# Altium footprint library microbuilder.PCBLIB: 422 footprints (part 16 of 27)
Each footprint in its own frame and in the unit in brackets; x right, y up, seen from the top. Pads: shape width x height; smd on the part's side, far side on the other; paste and mask are expansions set on the pad; w line width, h text height; cw(c..) or ccw(c..) is an arc to the next point about the centre after c.
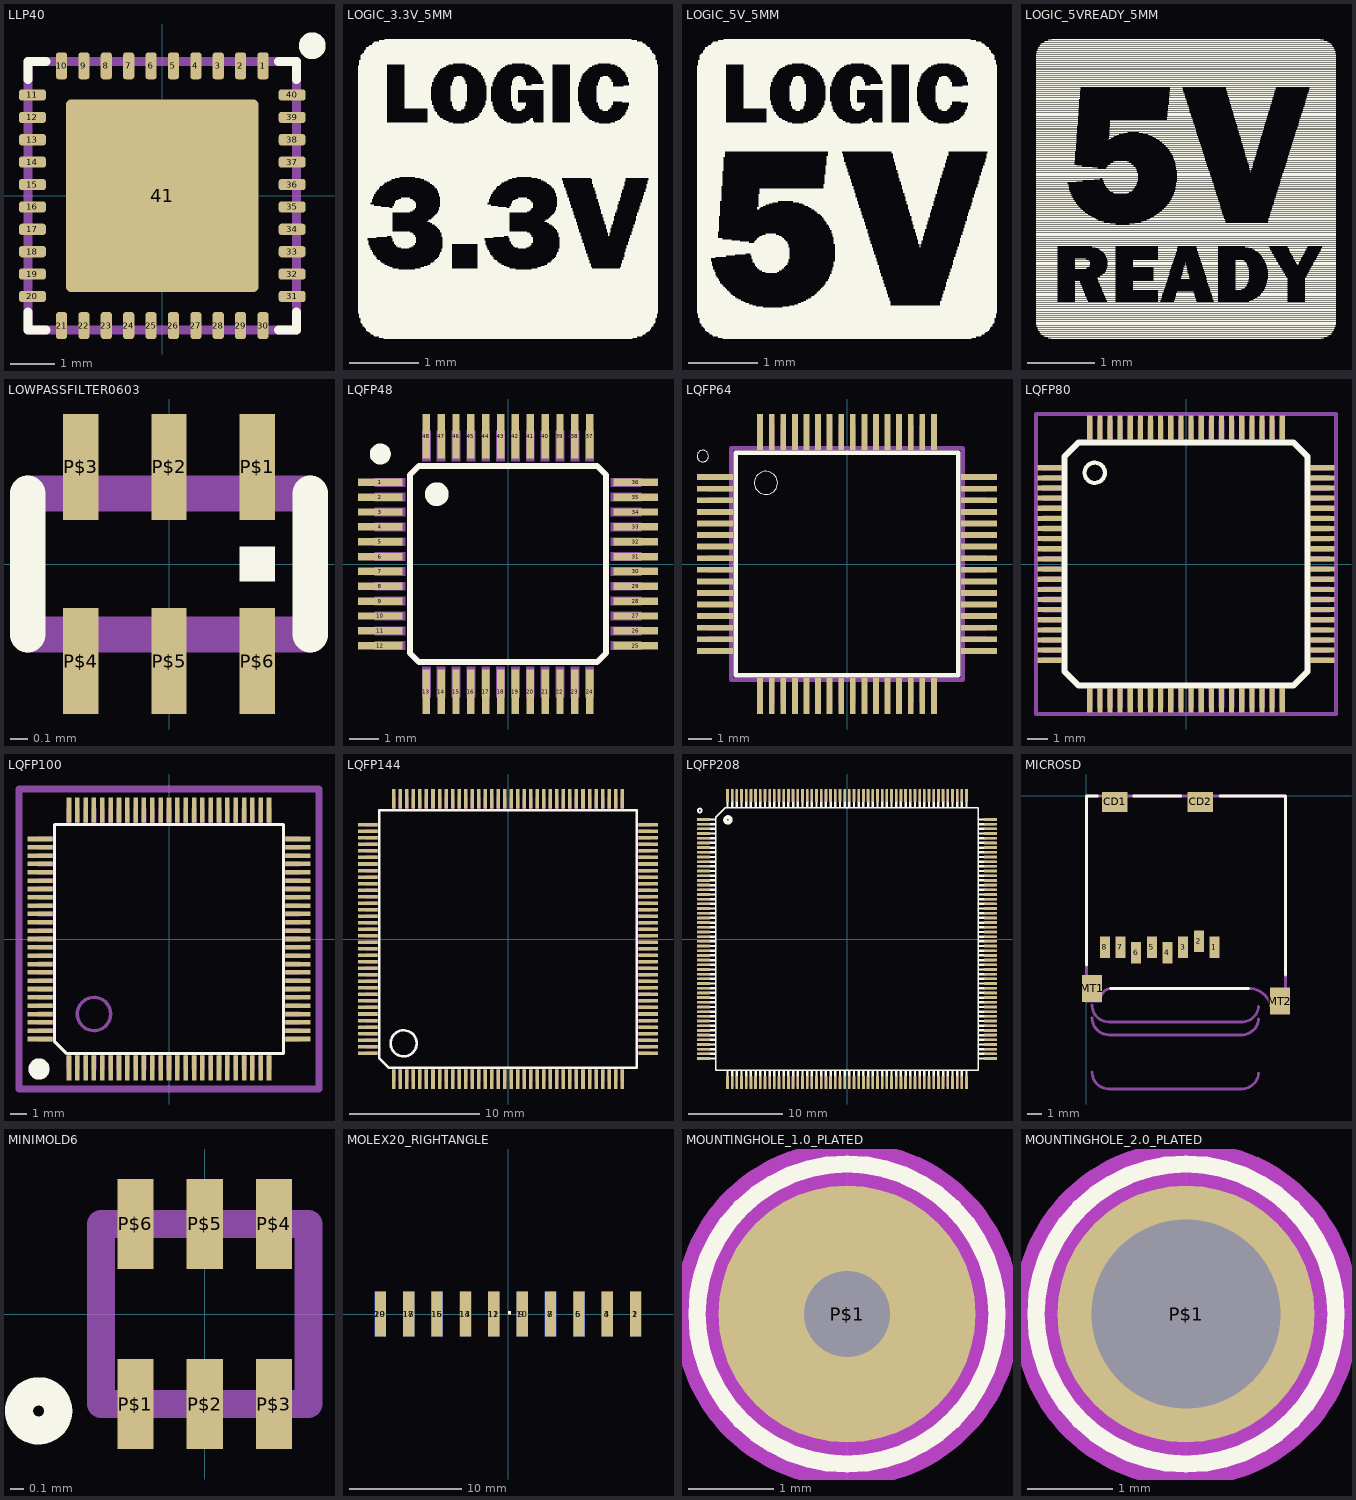
[diagram p15: the footprints below, top view; thin cyan lines are the x and y axes]

## LLP40 [mm]
pads (41):
  rrect50% 0.25x0.6 smd: 1(2.25,2.9) 2(1.75,2.9) 3(1.25,2.9) 4(0.75,2.9) 5(0.25,2.9) 6(-0.25,2.9) 7(-0.75,2.9) 8(-1.25,2.9) 9(-1.75,2.9) 10(-2.25,2.9) 21(-2.25,-2.9) 22(-1.75,-2.9) 23(-1.25,-2.9) 24(-0.75,-2.9) 25(-0.25,-2.9) 26(0.25,-2.9) 27(0.75,-2.9) 28(1.25,-2.9) 29(1.75,-2.9) 30(2.25,-2.9)
  rrect50% 0.6x0.25 smd: 11(-2.9,2.25) 12(-2.9,1.75) 13(-2.9,1.25) 14(-2.9,0.75) 15(-2.9,0.25) 16(-2.9,-0.25) 17(-2.9,-0.75) 18(-2.9,-1.25) 19(-2.9,-1.75) 20(-2.9,-2.25) 31(2.9,-2.25) 32(2.9,-1.75) 33(2.9,-1.25) 34(2.9,-0.75) 35(2.9,-0.25) 36(2.9,0.25) 37(2.9,0.75) 38(2.9,1.25) 39(2.9,1.75) 40(2.9,2.25)
  rrect5% 4.3x4.3 smd: 41(0,0)
Top Overlay:
  circle w0.3: c3.35,3.35 r0.15
  lines w0.203: -3,-2.6 -3,-3 -2.6,-3 ; -3,2.6 -3,3 -2.6,3 ; 2.6,-3 3,-3 3,-2.6 ; 2.6,3 3,3 3,2.6
Top Paste:
  rectangle: -2,1 -1,2
  rectangle: -0.5,1 0.5,2
  rectangle: 1,1 2,2
  rectangle: 1,-0.5 2,0.5
  rectangle: -0.5,-0.5 0.5,0.5
  rectangle: -2,-0.5 -1,0.5
  rectangle: -2,-2 -1,-1
  rectangle: -0.5,-2 0.5,-1
  rectangle: 1,-2 2,-1
Mechanical 16:
  lines w0.203: -3,-3 -3,3 3,3 3,-3 -3,-3

## LOGIC_3.3V_5MM [mm]
Top Overlay:
  drawing of 941 lines, arcs and shapes, not listed

## LOGIC_5V_5MM [mm]
Top Overlay:
  drawing of 975 lines, arcs and shapes, not listed

## LOGIC_5VREADY_5MM [mm]
Top Overlay:
  drawing of 1595 lines, arcs and shapes, not listed

## LOWPASSFILTER0603 [mm]
pads (6):
  rect 0.2x0.6 smd: P$1(0.5,0.55) P$2(0,0.55) P$3(-0.5,0.55) P$4(-0.5,-0.55) P$5(0,-0.55) P$6(0.5,-0.55)
Top Overlay:
  rectangle: 0.4,-0.1 0.6,0.1
  lines w0.203: -0.8,-0.4 -0.8,0.4 ; 0.8,-0.4 0.8,0.4
Mechanical 16:
  lines w0.127: -0.8,-0.4 -0.8,0.4 ; 0.8,-0.4 0.8,0.4
  lines w0.203: -0.8,-0.4 0.8,-0.4 ; -0.8,0.4 0.8,0.4

## LQFP48 [mm]
pads (48):
  rect 1.5x0.25 smd: 1(-4.3,2.75) 2(-4.3,2.25) 3(-4.3,1.75) 4(-4.3,1.25) 5(-4.3,0.75) 6(-4.3,0.25) 7(-4.3,-0.25) 8(-4.3,-0.75) 9(-4.3,-1.25) 10(-4.3,-1.75) 11(-4.3,-2.25) 12(-4.3,-2.75) 25(4.3,-2.75) 26(4.3,-2.25) 27(4.3,-1.75) 28(4.3,-1.25) 29(4.3,-0.75) 30(4.3,-0.25) 31(4.3,0.25) 32(4.3,0.75) 33(4.3,1.25) 34(4.3,1.75) 35(4.3,2.25) 36(4.3,2.75)
  rect 0.25x1.5 smd: 13(-2.75,-4.3) 14(-2.25,-4.3) 15(-1.75,-4.3) 16(-1.25,-4.3) 17(-0.75,-4.3) 18(-0.25,-4.3) 19(0.25,-4.3) 20(0.75,-4.3) 21(1.25,-4.3) 22(1.75,-4.3) 23(2.25,-4.3) 24(2.75,-4.3) 37(2.75,4.3) 38(2.25,4.3) 39(1.75,4.3) 40(1.25,4.3) 41(0.75,4.3) 42(0.25,4.3) 43(-0.25,4.3) 44(-0.75,4.3) 45(-1.25,4.3) 46(-1.75,4.3) 47(-2.25,4.3) 48(-2.75,4.3)
Top Overlay:
  circle w0.406: c-4.3,3.704 r0.15
  circle w0.4: c-2.4,2.35 r0.2
  lines w0.203: -3.3,-3 -3.3,3 -3,3.3 3,3.3 3.3,3 3.3,-3 3,-3.3 -3,-3.3 -3.3,-3
Mechanical 16:
  rectangle: -4.5,2.6 -3.45,2.9
  rectangle: -4.5,2.1 -3.45,2.4
  rectangle: -4.5,1.6 -3.45,1.9
  rectangle: -4.5,1.1 -3.45,1.4
  rectangle: -4.5,0.6 -3.45,0.9
  rectangle: -4.5,0.1 -3.45,0.4
  rectangle: -4.5,-0.4 -3.45,-0.1
  rectangle: -4.5,-0.9 -3.45,-0.6
  rectangle: -4.5,-1.4 -3.45,-1.1
  rectangle: -4.5,-1.9 -3.45,-1.6
  rectangle: -4.5,-2.4 -3.45,-2.1
  rectangle: -4.5,-2.9 -3.45,-2.6
  rectangle: -2.9,-4.5 -2.6,-3.45
  rectangle: -2.4,-4.5 -2.1,-3.45
  rectangle: -1.9,-4.5 -1.6,-3.45
  rectangle: -1.4,-4.5 -1.1,-3.45
  rectangle: -0.9,-4.5 -0.6,-3.45
  rectangle: -0.4,-4.5 -0.1,-3.45
  rectangle: 0.1,-4.5 0.4,-3.45
  rectangle: 0.6,-4.5 0.9,-3.45
  rectangle: 1.1,-4.5 1.4,-3.45
  rectangle: 1.6,-4.5 1.9,-3.45
  rectangle: 2.1,-4.5 2.4,-3.45
  rectangle: 2.6,-4.5 2.9,-3.45
  rectangle: 3.45,-2.9 4.5,-2.6
  rectangle: 3.45,-2.4 4.5,-2.1
  rectangle: 3.45,-1.9 4.5,-1.6
  rectangle: 3.45,-1.4 4.5,-1.1
  rectangle: 3.45,-0.9 4.5,-0.6
  rectangle: 3.45,-0.4 4.5,-0.1
  rectangle: 3.45,0.1 4.5,0.4
  rectangle: 3.45,0.6 4.5,0.9
  rectangle: 3.45,1.1 4.5,1.4
  rectangle: 3.45,1.6 4.5,1.9
  rectangle: 3.45,2.1 4.5,2.4
  rectangle: 3.45,2.6 4.5,2.9
  rectangle: 2.6,3.45 2.9,4.5
  rectangle: 2.1,3.45 2.4,4.5
  rectangle: 1.6,3.45 1.9,4.5
  rectangle: 1.1,3.45 1.4,4.5
  rectangle: 0.6,3.45 0.9,4.5
  rectangle: 0.1,3.45 0.4,4.5
  rectangle: -0.4,3.45 -0.1,4.5
  rectangle: -0.9,3.45 -0.6,4.5
  rectangle: -1.4,3.45 -1.1,4.5
  rectangle: -1.9,3.45 -1.6,4.5
  rectangle: -2.4,3.45 -2.1,4.5
  rectangle: -2.9,3.45 -2.6,4.5

## LQFP64 [mm]
pads (64):
  rect 1.55x0.25 smd: 1(-5.7,3.75) 2(-5.7,3.25) 3(-5.7,2.75) 4(-5.7,2.25) 5(-5.7,1.75) 6(-5.7,1.25) 7(-5.7,0.75) 8(-5.7,0.25) 9(-5.7,-0.25) 10(-5.7,-0.75) 11(-5.7,-1.25) 12(-5.7,-1.75) 13(-5.7,-2.25) 14(-5.7,-2.75) 15(-5.7,-3.25) 16(-5.7,-3.75) 33(5.7,-3.75) 34(5.7,-3.25) 35(5.7,-2.75) 36(5.7,-2.25) 37(5.7,-1.75) 38(5.7,-1.25) 39(5.7,-0.75) 40(5.7,-0.25) 41(5.7,0.25) 42(5.7,0.75) 43(5.7,1.25) 44(5.7,1.75) 45(5.7,2.25) 46(5.7,2.75) 47(5.7,3.25) 48(5.7,3.75)
  rect 0.25x1.55 smd: 17(-3.75,-5.7) 18(-3.25,-5.7) 19(-2.75,-5.7) 20(-2.25,-5.7) 21(-1.75,-5.7) 22(-1.25,-5.7) 23(-0.75,-5.7) 24(-0.25,-5.7) 25(0.25,-5.7) 26(0.75,-5.7) 27(1.25,-5.7) 28(1.75,-5.7) 29(2.25,-5.7) 30(2.75,-5.7) 31(3.25,-5.7) 32(3.75,-5.7) 49(3.75,5.7) 50(3.25,5.7) 51(2.75,5.7) 52(2.25,5.7) 53(1.75,5.7) 54(1.25,5.7) 55(0.75,5.7) 56(0.25,5.7) 57(-0.25,5.7) 58(-0.75,5.7) 59(-1.25,5.7) 60(-1.75,5.7) 61(-2.25,5.7) 62(-2.75,5.7) 63(-3.25,5.7) 64(-3.75,5.7)
Top Overlay:
  circle w0: c-6.225,4.658 r0.25
  circle w0: c-3.5,3.5 r0.5
  lines w0.203: -4.8,-4.8 -4.8,4.8 4.8,4.8 4.8,-4.8 -4.8,-4.8
Mechanical 16:
  rectangle: -6,3.64 -5,3.86
  rectangle: -6,3.14 -5,3.36
  rectangle: -6,2.64 -5,2.86
  rectangle: -6,2.14 -5,2.36
  rectangle: -6,1.64 -5,1.86
  rectangle: -6,1.14 -5,1.36
  rectangle: -6,0.64 -5,0.86
  rectangle: -6,0.14 -5,0.36
  rectangle: -6,-0.36 -5,-0.14
  rectangle: -6,-0.86 -5,-0.64
  rectangle: -6,-1.36 -5,-1.14
  rectangle: -6,-1.86 -5,-1.64
  rectangle: -6,-2.36 -5,-2.14
  rectangle: -6,-2.86 -5,-2.64
  rectangle: -6,-3.36 -5,-3.14
  rectangle: -6,-3.86 -5,-3.64
  rectangle: -3.86,-6 -3.64,-5
  rectangle: -3.36,-6 -3.14,-5
  rectangle: -2.86,-6 -2.64,-5
  rectangle: -2.36,-6 -2.14,-5
  rectangle: -1.86,-6 -1.64,-5
  rectangle: -1.36,-6 -1.14,-5
  rectangle: -0.86,-6 -0.64,-5
  rectangle: -0.36,-6 -0.14,-5
  rectangle: 0.14,-6 0.36,-5
  rectangle: 0.64,-6 0.86,-5
  rectangle: 1.14,-6 1.36,-5
  rectangle: 1.64,-6 1.86,-5
  rectangle: 2.14,-6 2.36,-5
  rectangle: 2.64,-6 2.86,-5
  rectangle: 3.14,-6 3.36,-5
  rectangle: 3.64,-6 3.86,-5
  rectangle: 5,-3.86 6,-3.64
  rectangle: 5,-3.36 6,-3.14
  rectangle: 5,-2.86 6,-2.64
  rectangle: 5,-2.36 6,-2.14
  rectangle: 5,-1.86 6,-1.64
  rectangle: 5,-1.36 6,-1.14
  rectangle: 5,-0.86 6,-0.64
  rectangle: 5,-0.36 6,-0.14
  rectangle: 5,0.14 6,0.36
  rectangle: 5,0.64 6,0.86
  rectangle: 5,1.14 6,1.36
  rectangle: 5,1.64 6,1.86
  rectangle: 5,2.14 6,2.36
  rectangle: 5,2.64 6,2.86
  rectangle: 5,3.14 6,3.36
  rectangle: 5,3.64 6,3.86
  rectangle: 3.64,5 3.86,6
  rectangle: 3.14,5 3.36,6
  rectangle: 2.64,5 2.86,6
  rectangle: 2.14,5 2.36,6
  rectangle: 1.64,5 1.86,6
  rectangle: 1.14,5 1.36,6
  rectangle: 0.64,5 0.86,6
  rectangle: 0.14,5 0.36,6
  rectangle: -0.36,5 -0.14,6
  rectangle: -0.86,5 -0.64,6
  rectangle: -1.36,5 -1.14,6
  rectangle: -1.86,5 -1.64,6
  rectangle: -2.36,5 -2.14,6
  rectangle: -2.86,5 -2.64,6
  rectangle: -3.36,5 -3.14,6
  rectangle: -3.86,5 -3.64,6
  lines w0.203: -5,-5 -5,5 5,5 5,-5 -5,-5

## LQFP80 [mil]
pads (80):
  rect 47.24x10 smd: 1(-264.76,187.01) 2(-264.76,167.32) 3(-264.76,147.64) 4(-264.76,127.95) 5(-264.76,108.27) 6(-264.76,88.58) 7(-264.76,68.9) 8(-264.76,49.21) 9(-264.76,29.53) 10(-264.76,9.84) 11(-264.76,-9.84) 12(-264.76,-29.53) 13(-264.76,-49.21) 14(-264.76,-68.9) 15(-264.76,-88.58) 16(-264.76,-108.27) 17(-264.76,-127.95) 18(-264.76,-147.64) 19(-264.76,-167.32) 20(-264.76,-187.01) 41(264.76,-187.01) 42(264.76,-167.32) 43(264.76,-147.64) 44(264.76,-127.95) 45(264.76,-108.27) 46(264.76,-88.58) 47(264.76,-68.9) 48(264.76,-49.21) 49(264.76,-29.53) 50(264.76,-9.84) 51(264.76,9.84) 52(264.76,29.53) 53(264.76,49.21) 54(264.76,68.9) 55(264.76,88.58) 56(264.76,108.27) 57(264.76,127.95) 58(264.76,147.64) 59(264.76,167.32) 60(264.76,187.01)
  rect 10x47.24 smd: 21(-187.01,-264.76) 22(-167.32,-264.76) 23(-147.64,-264.76) 24(-127.95,-264.76) 25(-108.27,-264.76) 26(-88.58,-264.76) 27(-68.9,-264.76) 28(-49.21,-264.76) 29(-29.53,-264.76) 30(-9.84,-264.76) 31(9.84,-264.76) 32(29.53,-264.76) 33(49.21,-264.76) 34(68.9,-264.76) 35(88.58,-264.76) 36(108.27,-264.76) 37(127.95,-264.76) 38(147.64,-264.76) 39(167.32,-264.76) 40(187.01,-264.76) 61(187.01,264.76) 62(167.32,264.76) 63(147.64,264.76) 64(127.95,264.76) 65(108.27,264.76) 66(88.58,264.76) 67(68.9,264.76) 68(49.21,264.76) 69(29.53,264.76) 70(9.84,264.76) 71(-9.84,264.76) 72(-29.53,264.76) 73(-49.21,264.76) 74(-68.9,264.76) 75(-88.58,264.76) 76(-108.27,264.76) 77(-127.95,264.76) 78(-147.64,264.76) 79(-167.32,264.76) 80(-187.01,264.76)
Top Overlay:
  circle w8: c-177.17,177.17 r19.68
  lines w12: -236.22,-208.66 -236.22,208.66 -208.66,236.22 208.66,236.22 236.22,208.66 236.22,-208.66 208.66,-236.22 -208.66,-236.22 -236.22,-208.66
Mechanical 16:
  region: 181.59,279.52 181.59,242.13 192.42,242.13 192.42,279.52
  region: 161.9,279.52 161.9,242.12 172.74,242.12 172.74,279.52
  region: 142.22,279.52 142.22,242.13 153.05,242.13 153.05,279.52
  region: 122.53,279.52 122.53,242.12 133.37,242.12 133.37,279.52
  region: 102.85,279.52 102.85,242.13 113.68,242.13 113.68,279.52
  region: 83.16,279.52 83.16,242.12 94,242.12 94,279.52
  region: 63.48,279.52 63.48,242.13 74.31,242.13 74.31,279.52
  region: 43.79,279.52 43.79,242.12 54.63,242.12 54.63,279.52
  region: 24.11,279.52 24.11,242.13 34.94,242.13 34.94,279.52
  region: 4.42,279.52 4.42,242.12 15.26,242.12 15.26,279.52
  region: -15.26,279.52 -15.26,242.13 -4.43,242.13 -4.43,279.52
  region: -34.94,279.52 -34.94,242.13 -24.11,242.13 -24.11,279.52
  region: -54.63,279.52 -54.63,242.13 -43.8,242.13 -43.8,279.52
  region: -74.31,279.52 -74.31,242.13 -63.48,242.13 -63.48,279.52
  region: -94,279.52 -94,242.13 -83.17,242.13 -83.17,279.52
  region: -113.68,279.52 -113.68,242.13 -102.85,242.13 -102.85,279.52
  region: -133.37,279.52 -133.37,242.13 -122.54,242.13 -122.54,279.52
  region: -153.05,279.52 -153.05,242.13 -142.22,242.13 -142.22,279.52
  region: -172.74,279.52 -172.74,242.13 -161.91,242.13 -161.91,279.52
  region: -192.42,279.52 -192.42,242.13 -181.59,242.13 -181.59,279.52
  rectangle: -279.52,181.59 -242.13,192.42
  rectangle: -279.52,161.91 -242.13,172.73
  rectangle: -279.52,142.22 -242.13,153.05
  rectangle: -279.52,122.54 -242.13,133.36
  rectangle: -279.52,102.85 -242.13,113.68
  rectangle: -279.52,83.17 -242.13,93.99
  rectangle: -279.52,63.48 -242.13,74.31
  rectangle: -279.52,43.8 -242.13,54.62
  rectangle: -279.52,24.11 -242.13,34.94
  rectangle: -279.52,4.43 -242.13,15.25
  rectangle: -279.52,-15.26 -242.13,-4.43
  rectangle: -279.52,-34.94 -242.13,-24.11
  rectangle: -279.52,-54.63 -242.13,-43.8
  rectangle: -279.52,-74.31 -242.13,-63.48
  rectangle: -279.52,-94 -242.13,-83.17
  rectangle: -279.52,-113.68 -242.13,-102.85
  rectangle: -279.52,-133.37 -242.13,-122.54
  rectangle: -279.52,-153.05 -242.13,-142.22
  rectangle: -279.52,-172.74 -242.13,-161.91
  rectangle: -279.52,-192.42 -242.13,-181.59
  region: -181.59,-279.52 -181.59,-242.13 -192.42,-242.13 -192.42,-279.52
  region: -161.9,-279.52 -161.9,-242.12 -172.74,-242.12 -172.74,-279.52
  region: -142.22,-279.52 -142.22,-242.13 -153.05,-242.13 -153.05,-279.52
  region: -122.53,-279.52 -122.53,-242.12 -133.37,-242.12 -133.37,-279.52
  region: -102.85,-279.52 -102.85,-242.13 -113.68,-242.13 -113.68,-279.52
  region: -83.16,-279.52 -83.16,-242.12 -94,-242.12 -94,-279.52
  region: -63.48,-279.52 -63.48,-242.13 -74.31,-242.13 -74.31,-279.52
  region: -43.79,-279.52 -43.79,-242.12 -54.63,-242.12 -54.63,-279.52
  region: -24.11,-279.52 -24.11,-242.13 -34.94,-242.13 -34.94,-279.52
  region: -4.42,-279.52 -4.42,-242.12 -15.26,-242.12 -15.26,-279.52
  region: 15.26,-279.52 15.26,-242.13 4.43,-242.13 4.43,-279.52
  region: 34.94,-279.52 34.94,-242.13 24.11,-242.13 24.11,-279.52
  region: 54.63,-279.52 54.63,-242.13 43.8,-242.13 43.8,-279.52
  region: 74.31,-279.52 74.31,-242.13 63.48,-242.13 63.48,-279.52
  region: 94,-279.52 94,-242.13 83.17,-242.13 83.17,-279.52
  region: 113.68,-279.52 113.68,-242.13 102.85,-242.13 102.85,-279.52
  region: 133.37,-279.52 133.37,-242.13 122.54,-242.13 122.54,-279.52
  region: 153.05,-279.52 153.05,-242.13 142.22,-242.13 142.22,-279.52
  region: 172.74,-279.52 172.74,-242.13 161.91,-242.13 161.91,-279.52
  region: 192.42,-279.52 192.42,-242.13 181.59,-242.13 181.59,-279.52
  region: 279.52,-181.59 242.13,-181.59 242.13,-192.42 279.52,-192.42
  region: 279.52,-161.91 242.13,-161.91 242.13,-172.73 279.52,-172.73
  region: 279.52,-142.22 242.13,-142.22 242.13,-153.05 279.52,-153.05
  region: 279.52,-122.54 242.13,-122.54 242.13,-133.36 279.52,-133.36
  region: 279.52,-102.85 242.13,-102.85 242.13,-113.68 279.52,-113.68
  region: 279.52,-83.17 242.13,-83.17 242.13,-93.99 279.52,-93.99
  region: 279.52,-63.48 242.13,-63.48 242.13,-74.31 279.52,-74.31
  region: 279.52,-43.8 242.13,-43.8 242.13,-54.62 279.52,-54.62
  region: 279.52,-24.11 242.13,-24.11 242.13,-34.94 279.52,-34.94
  region: 279.52,-4.43 242.13,-4.43 242.13,-15.25 279.52,-15.25
  region: 279.52,15.26 242.13,15.26 242.13,4.43 279.52,4.43
  region: 279.52,34.94 242.13,34.94 242.13,24.11 279.52,24.11
  region: 279.52,54.63 242.13,54.63 242.13,43.8 279.52,43.8
  region: 279.52,74.31 242.13,74.31 242.13,63.48 279.52,63.48
  region: 279.52,94 242.13,94 242.13,83.17 279.52,83.17
  region: 279.52,113.68 242.13,113.68 242.13,102.85 279.52,102.85
  region: 279.52,133.37 242.13,133.37 242.13,122.54 279.52,122.54
  region: 279.52,153.05 242.13,153.05 242.13,142.22 279.52,142.22
  region: 279.52,172.74 242.13,172.74 242.13,161.91 279.52,161.91
  region: 279.52,192.42 242.13,192.42 242.13,181.59 279.52,181.59
Mechanical 27:
  lines w7.87: -291.34,-291.34 -291.34,291.34 291.34,291.34 291.34,-291.34 -291.34,-291.34

## LQFP100 [mm]
pads (100):
  rect 0.27x1.5 smd: 1(-6,-7.75) 2(-5.5,-7.75) 3(-5,-7.75) 4(-4.5,-7.75) 5(-4,-7.75) 6(-3.5,-7.75) 7(-3,-7.75) 8(-2.5,-7.75) 9(-2,-7.75) 10(-1.5,-7.75) 11(-1,-7.75) 12(-0.5,-7.75) 13(0,-7.75) 14(0.5,-7.75) 15(1,-7.75) 16(1.5,-7.75) 17(2,-7.75) 18(2.5,-7.75) 19(3,-7.75) 20(3.5,-7.75) 21(4,-7.75) 22(4.5,-7.75) 23(5,-7.75) 24(5.5,-7.75) 25(6,-7.75) 51(6,7.75) 52(5.5,7.75) 53(5,7.75) 54(4.5,7.75) 55(4,7.75) 56(3.5,7.75) 57(3,7.75) 58(2.5,7.75) 59(2,7.75) 60(1.5,7.75) 61(1,7.75) 62(0.5,7.75) 63(0,7.75) 64(-0.5,7.75) 65(-1,7.75) 66(-1.5,7.75) 67(-2,7.75) 68(-2.5,7.75) 69(-3,7.75) 70(-3.5,7.75) 71(-4,7.75) 72(-4.5,7.75) 73(-5,7.75) 74(-5.5,7.75) 75(-6,7.75)
  rect 1.5x0.27 smd: 26(7.75,-6) 27(7.75,-5.5) 28(7.75,-5) 29(7.75,-4.5) 30(7.75,-4) 31(7.75,-3.5) 32(7.75,-3) 33(7.75,-2.5) 34(7.75,-2) 35(7.75,-1.5) 36(7.75,-1) 37(7.75,-0.5) 38(7.75,0) 39(7.75,0.5) 40(7.75,1) 41(7.75,1.5) 42(7.75,2) 43(7.75,2.5) 44(7.75,3) 45(7.75,3.5) 46(7.75,4) 47(7.75,4.5) 48(7.75,5) 49(7.75,5.5) 50(7.75,6) 76(-7.75,6) 77(-7.75,5.5) 78(-7.75,5) 79(-7.75,4.5) 80(-7.75,4) 81(-7.75,3.5) 82(-7.75,3) 83(-7.75,2.5) 84(-7.75,2) 85(-7.75,1.5) 86(-7.75,1) 87(-7.75,0.5) 88(-7.75,0) 89(-7.75,-0.5) 90(-7.75,-1) 91(-7.75,-1.5) 92(-7.75,-2) 93(-7.75,-2.5) 94(-7.75,-3) 95(-7.75,-3.5) 96(-7.75,-4) 97(-7.75,-4.5) 98(-7.75,-5) 99(-7.75,-5.5) 100(-7.75,-6)
Top Overlay:
  circle w0.635: c-7.802,-7.802 r0.318
  lines w0.203: -6.873,-6.123 -6.123,-6.873 6.873,-6.873 6.873,6.873 -6.873,6.873 -6.873,-6.123
Mechanical 16:
  circle w0.203: c-4.5,-4.5 r1
  rectangle: -6.135,6.868 -5.865,7.873
  rectangle: -5.635,6.868 -5.365,7.873
  rectangle: -5.135,6.868 -4.865,7.873
  rectangle: -4.635,6.868 -4.365,7.873
  rectangle: -4.135,6.868 -3.865,7.873
  rectangle: -3.635,6.868 -3.365,7.873
  rectangle: -3.135,6.868 -2.865,7.873
  rectangle: -2.635,6.868 -2.365,7.873
  rectangle: -2.135,6.868 -1.865,7.873
  rectangle: -1.635,6.868 -1.365,7.873
  rectangle: -1.135,6.868 -0.865,7.873
  rectangle: -0.635,6.868 -0.365,7.873
  rectangle: -0.135,6.868 0.135,7.873
  rectangle: 0.365,6.868 0.635,7.873
  rectangle: 0.865,6.868 1.135,7.873
  rectangle: 1.365,6.868 1.635,7.873
  rectangle: 1.865,6.868 2.135,7.873
  rectangle: 2.365,6.868 2.635,7.873
  rectangle: 2.865,6.868 3.135,7.873
  rectangle: 3.365,6.868 3.635,7.873
  rectangle: 3.865,6.868 4.135,7.873
  rectangle: 4.365,6.868 4.635,7.873
  rectangle: 4.865,6.868 5.135,7.873
  rectangle: 5.365,6.868 5.635,7.873
  rectangle: 5.865,6.868 6.135,7.873
  rectangle: 6.873,5.865 7.878,6.135
  rectangle: 6.873,5.365 7.878,5.635
  rectangle: 6.873,4.865 7.878,5.135
  rectangle: 6.873,4.365 7.878,4.635
  rectangle: 6.873,3.865 7.878,4.135
  rectangle: 6.873,3.365 7.878,3.635
  rectangle: 6.873,2.865 7.878,3.135
  rectangle: 6.873,2.365 7.878,2.635
  rectangle: 6.873,1.865 7.878,2.135
  rectangle: 6.873,1.365 7.878,1.635
  rectangle: 6.873,0.865 7.878,1.135
  rectangle: 6.873,0.365 7.878,0.635
  rectangle: 6.873,-0.135 7.878,0.135
  rectangle: 6.873,-0.635 7.878,-0.365
  rectangle: 6.873,-1.135 7.878,-0.865
  rectangle: 6.873,-1.635 7.878,-1.365
  rectangle: 6.873,-2.135 7.878,-1.865
  rectangle: 6.873,-2.635 7.878,-2.365
  rectangle: 6.873,-3.135 7.878,-2.865
  rectangle: 6.873,-3.635 7.878,-3.365
  rectangle: 6.873,-4.135 7.878,-3.865
  rectangle: 6.873,-4.635 7.878,-4.365
  rectangle: 6.873,-5.135 7.878,-4.865
  rectangle: 6.873,-5.635 7.878,-5.365
  rectangle: 6.873,-6.135 7.878,-5.865
  rectangle: 5.865,-7.873 6.135,-6.868
  rectangle: 5.365,-7.873 5.635,-6.868
  rectangle: 4.865,-7.873 5.135,-6.868
  rectangle: 4.365,-7.873 4.635,-6.868
  rectangle: 3.865,-7.873 4.135,-6.868
  rectangle: 3.365,-7.873 3.635,-6.868
  rectangle: 2.865,-7.873 3.135,-6.868
  rectangle: 2.365,-7.873 2.635,-6.868
  rectangle: 1.865,-7.873 2.135,-6.868
  rectangle: 1.365,-7.873 1.635,-6.868
  rectangle: 0.865,-7.873 1.135,-6.868
  rectangle: 0.365,-7.873 0.635,-6.868
  rectangle: -0.135,-7.873 0.135,-6.868
  rectangle: -0.635,-7.873 -0.365,-6.868
  rectangle: -1.135,-7.873 -0.865,-6.868
  rectangle: -1.635,-7.873 -1.365,-6.868
  rectangle: -2.135,-7.873 -1.865,-6.868
  rectangle: -2.635,-7.873 -2.365,-6.868
  rectangle: -3.135,-7.873 -2.865,-6.868
  rectangle: -3.635,-7.873 -3.365,-6.868
  rectangle: -4.135,-7.873 -3.865,-6.868
  rectangle: -4.635,-7.873 -4.365,-6.868
  rectangle: -5.135,-7.873 -4.865,-6.868
  rectangle: -5.635,-7.873 -5.365,-6.868
  rectangle: -6.135,-7.873 -5.865,-6.868
  rectangle: -7.878,-6.135 -6.873,-5.865
  rectangle: -7.878,-5.635 -6.873,-5.365
  rectangle: -7.878,-5.135 -6.873,-4.865
  rectangle: -7.878,-4.635 -6.873,-4.365
  rectangle: -7.878,-4.135 -6.873,-3.865
  rectangle: -7.878,-3.635 -6.873,-3.365
  rectangle: -7.878,-3.135 -6.873,-2.865
  rectangle: -7.878,-2.635 -6.873,-2.365
  rectangle: -7.878,-2.135 -6.873,-1.865
  rectangle: -7.878,-1.635 -6.873,-1.365
  rectangle: -7.878,-1.135 -6.873,-0.865
  rectangle: -7.878,-0.635 -6.873,-0.365
  rectangle: -7.878,-0.135 -6.873,0.135
  rectangle: -7.878,0.365 -6.873,0.635
  rectangle: -7.878,0.865 -6.873,1.135
  rectangle: -7.878,1.365 -6.873,1.635
  rectangle: -7.878,1.865 -6.873,2.135
  rectangle: -7.878,2.365 -6.873,2.635
  rectangle: -7.878,2.865 -6.873,3.135
  rectangle: -7.878,3.365 -6.873,3.635
  rectangle: -7.878,3.865 -6.873,4.135
  rectangle: -7.878,4.365 -6.873,4.635
  rectangle: -7.878,4.865 -6.873,5.135
  rectangle: -7.878,5.365 -6.873,5.635
  rectangle: -7.878,5.865 -6.873,6.135
Mechanical 27:
  lines w0.406: -9,-9 9,-9 9,9 -9,9 -9,-9

## LQFP144 [mm]
pads (144):
  rect 0.27x1.5 smd: 1(-8.75,-10.75) 2(-8.25,-10.75) 3(-7.75,-10.75) 4(-7.25,-10.75) 5(-6.75,-10.75) 6(-6.25,-10.75) 7(-5.75,-10.75) 8(-5.25,-10.75) 9(-4.75,-10.75) 10(-4.25,-10.75) 11(-3.75,-10.75) 12(-3.25,-10.75) 13(-2.75,-10.75) 14(-2.25,-10.75) 15(-1.75,-10.75) 16(-1.25,-10.75) 17(-0.75,-10.75) 18(-0.25,-10.75) 19(0.25,-10.75) 20(0.75,-10.75) 21(1.25,-10.75) 22(1.75,-10.75) 23(2.25,-10.75) 24(2.75,-10.75) 25(3.25,-10.75) 26(3.75,-10.75) 27(4.25,-10.75) 28(4.75,-10.75) 29(5.25,-10.75) 30(5.75,-10.75) 31(6.25,-10.75) 32(6.75,-10.75) 33(7.25,-10.75) 34(7.75,-10.75) 35(8.25,-10.75) 36(8.75,-10.75) 73(8.75,10.75) 74(8.25,10.75) 75(7.75,10.75) 76(7.25,10.75) 77(6.75,10.75) 78(6.25,10.75) 79(5.75,10.75) 80(5.25,10.75) 81(4.75,10.75) 82(4.25,10.75) 83(3.75,10.75) 84(3.25,10.75) 85(2.75,10.75) 86(2.25,10.75) 87(1.75,10.75) 88(1.25,10.75) 89(0.75,10.75) 90(0.25,10.75) 91(-0.25,10.75) 92(-0.75,10.75) 93(-1.25,10.75) 94(-1.75,10.75) 95(-2.25,10.75) 96(-2.75,10.75) 97(-3.25,10.75) 98(-3.75,10.75) 99(-4.25,10.75) 100(-4.75,10.75) 101(-5.25,10.75) 102(-5.75,10.75) 103(-6.25,10.75) 104(-6.75,10.75) 105(-7.25,10.75) 106(-7.75,10.75) 107(-8.25,10.75) 108(-8.75,10.75)
  rect 1.5x0.27 smd: 37(10.75,-8.75) 38(10.75,-8.25) 39(10.75,-7.75) 40(10.75,-7.25) 41(10.75,-6.75) 42(10.75,-6.25) 43(10.75,-5.75) 44(10.75,-5.25) 45(10.75,-4.75) 46(10.75,-4.25) 47(10.75,-3.75) 48(10.75,-3.25) 49(10.75,-2.75) 50(10.75,-2.25) 51(10.75,-1.75) 52(10.75,-1.25) 53(10.75,-0.75) 54(10.75,-0.25) 55(10.75,0.25) 56(10.75,0.75) 57(10.75,1.25) 58(10.75,1.75) 59(10.75,2.25) 60(10.75,2.75) 61(10.75,3.25) 62(10.75,3.75) 63(10.75,4.25) 64(10.75,4.75) 65(10.75,5.25) 66(10.75,5.75) 67(10.75,6.25) 68(10.75,6.75) 69(10.75,7.25) 70(10.75,7.75) 71(10.75,8.25) 72(10.75,8.75) 109(-10.75,8.75) 110(-10.75,8.25) 111(-10.75,7.75) 112(-10.75,7.25) 113(-10.75,6.75) 114(-10.75,6.25) 115(-10.75,5.75) 116(-10.75,5.25) 117(-10.75,4.75) 118(-10.75,4.25) 119(-10.75,3.75) 120(-10.75,3.25) 121(-10.75,2.75) 122(-10.75,2.25) 123(-10.75,1.75) 124(-10.75,1.25) 125(-10.75,0.75) 126(-10.75,0.25) 127(-10.75,-0.25) 128(-10.75,-0.75) 129(-10.75,-1.25) 130(-10.75,-1.75) 131(-10.75,-2.25) 132(-10.75,-2.75) 133(-10.75,-3.25) 134(-10.75,-3.75) 135(-10.75,-4.25) 136(-10.75,-4.75) 137(-10.75,-5.25) 138(-10.75,-5.75) 139(-10.75,-6.25) 140(-10.75,-6.75) 141(-10.75,-7.25) 142(-10.75,-7.75) 143(-10.75,-8.25) 144(-10.75,-8.75)
Top Overlay:
  circle w0.203: c-8,-8 r1
  lines w0.203: -9.873,-9.123 -9.123,-9.873 9.873,-9.873 9.873,9.873 -9.873,9.873 -9.873,-9.123
Mechanical 16:
  rectangle: -8.885,9.87 -8.615,10.873
  rectangle: -8.385,9.87 -8.115,10.873
  rectangle: -7.885,9.87 -7.615,10.873
  rectangle: -7.385,9.87 -7.115,10.873
  rectangle: -6.885,9.87 -6.615,10.873
  rectangle: -6.385,9.87 -6.115,10.873
  rectangle: -5.885,9.87 -5.615,10.873
  rectangle: -5.385,9.87 -5.115,10.873
  rectangle: -4.885,9.87 -4.615,10.873
  rectangle: -4.385,9.87 -4.115,10.873
  rectangle: -3.885,9.87 -3.615,10.873
  rectangle: -3.385,9.87 -3.115,10.873
  rectangle: -2.885,9.87 -2.615,10.873
  rectangle: -2.385,9.87 -2.115,10.873
  rectangle: -1.885,9.87 -1.615,10.873
  rectangle: -1.385,9.87 -1.115,10.873
  rectangle: -0.885,9.87 -0.615,10.873
  rectangle: -0.385,9.87 -0.115,10.873
  rectangle: 0.115,9.87 0.385,10.873
  rectangle: 0.615,9.87 0.885,10.873
  rectangle: 1.115,9.87 1.385,10.873
  rectangle: 1.615,9.87 1.885,10.873
  rectangle: 2.115,9.87 2.385,10.873
  rectangle: 2.615,9.87 2.885,10.873
  rectangle: 3.115,9.87 3.385,10.873
  rectangle: 3.615,9.87 3.885,10.873
  rectangle: 4.115,9.87 4.385,10.873
  rectangle: 4.615,9.87 4.885,10.873
  rectangle: 5.115,9.87 5.385,10.873
  rectangle: 5.615,9.87 5.885,10.873
  rectangle: 6.115,9.87 6.385,10.873
  rectangle: 6.615,9.87 6.885,10.873
  rectangle: 7.115,9.87 7.385,10.873
  rectangle: 7.615,9.87 7.885,10.873
  rectangle: 8.115,9.87 8.385,10.873
  rectangle: 8.615,9.87 8.885,10.873
  rectangle: -8.885,-10.876 -8.615,-9.873
  rectangle: -8.385,-10.876 -8.115,-9.873
  rectangle: -7.885,-10.876 -7.615,-9.873
  rectangle: -7.385,-10.876 -7.115,-9.873
  rectangle: -6.885,-10.876 -6.615,-9.873
  rectangle: -6.385,-10.876 -6.115,-9.873
  rectangle: -5.885,-10.876 -5.615,-9.873
  rectangle: -5.385,-10.876 -5.115,-9.873
  rectangle: -4.885,-10.876 -4.615,-9.873
  rectangle: -4.385,-10.876 -4.115,-9.873
  rectangle: -3.885,-10.876 -3.615,-9.873
  rectangle: -3.385,-10.876 -3.115,-9.873
  rectangle: -2.885,-10.876 -2.615,-9.873
  rectangle: -2.385,-10.876 -2.115,-9.873
  rectangle: -1.885,-10.876 -1.615,-9.873
  rectangle: -1.385,-10.876 -1.115,-9.873
  rectangle: -0.885,-10.876 -0.615,-9.873
  rectangle: -0.385,-10.876 -0.115,-9.873
  rectangle: 0.115,-10.876 0.385,-9.873
  rectangle: 0.615,-10.876 0.885,-9.873
  rectangle: 1.115,-10.876 1.385,-9.873
  rectangle: 1.615,-10.876 1.885,-9.873
  rectangle: 2.115,-10.876 2.385,-9.873
  rectangle: 2.615,-10.876 2.885,-9.873
  rectangle: 3.115,-10.876 3.385,-9.873
  rectangle: 3.615,-10.876 3.885,-9.873
  rectangle: 4.115,-10.876 4.385,-9.873
  rectangle: 4.615,-10.876 4.885,-9.873
  rectangle: 5.115,-10.876 5.385,-9.873
  rectangle: 5.615,-10.876 5.885,-9.873
  rectangle: 6.115,-10.876 6.385,-9.873
  rectangle: 6.615,-10.876 6.885,-9.873
  rectangle: 7.115,-10.876 7.385,-9.873
  rectangle: 7.615,-10.876 7.885,-9.873
  rectangle: 8.115,-10.876 8.385,-9.873
  rectangle: 8.615,-10.876 8.885,-9.873
  rectangle: 9.873,-8.885 10.876,-8.615
  rectangle: 9.873,-8.385 10.876,-8.115
  rectangle: 9.873,-7.885 10.876,-7.615
  rectangle: 9.873,-7.385 10.876,-7.115
  rectangle: 9.873,-6.885 10.876,-6.615
  rectangle: 9.873,-6.385 10.876,-6.115
  rectangle: 9.873,-5.885 10.876,-5.615
  rectangle: 9.873,-5.385 10.876,-5.115
  rectangle: 9.873,-4.885 10.876,-4.615
  rectangle: 9.873,-4.385 10.876,-4.115
  rectangle: 9.873,-3.885 10.876,-3.615
  rectangle: 9.873,-3.385 10.876,-3.115
  rectangle: 9.873,-2.885 10.876,-2.615
  rectangle: 9.873,-2.385 10.876,-2.115
  rectangle: 9.873,-1.885 10.876,-1.615
  rectangle: 9.873,-1.385 10.876,-1.115
  rectangle: 9.873,-0.885 10.876,-0.615
  rectangle: 9.873,-0.385 10.876,-0.115
  rectangle: 9.873,0.115 10.876,0.385
  rectangle: 9.873,0.615 10.876,0.885
  rectangle: 9.873,1.115 10.876,1.385
  rectangle: 9.873,1.615 10.876,1.885
  rectangle: 9.873,2.115 10.876,2.385
  rectangle: 9.873,2.615 10.876,2.885
  rectangle: 9.873,3.115 10.876,3.385
  rectangle: 9.873,3.615 10.876,3.885
  rectangle: 9.873,4.115 10.876,4.385
  rectangle: 9.873,4.615 10.876,4.885
  rectangle: 9.873,5.115 10.876,5.385
  rectangle: 9.873,5.615 10.876,5.885
  rectangle: 9.873,6.115 10.876,6.385
  rectangle: 9.873,6.615 10.876,6.885
  rectangle: 9.873,7.115 10.876,7.385
  rectangle: 9.873,7.615 10.876,7.885
  rectangle: 9.873,8.115 10.876,8.385
  rectangle: 9.873,8.615 10.876,8.885
  rectangle: -10.873,-8.885 -9.87,-8.615
  rectangle: -10.873,-8.385 -9.87,-8.115
  rectangle: -10.873,-7.885 -9.87,-7.615
  rectangle: -10.873,-7.385 -9.87,-7.115
  rectangle: -10.873,-6.885 -9.87,-6.615
  rectangle: -10.873,-6.385 -9.87,-6.115
  rectangle: -10.873,-5.885 -9.87,-5.615
  rectangle: -10.873,-5.385 -9.87,-5.115
  rectangle: -10.873,-4.885 -9.87,-4.615
  rectangle: -10.873,-4.385 -9.87,-4.115
  rectangle: -10.873,-3.885 -9.87,-3.615
  rectangle: -10.873,-3.385 -9.87,-3.115
  rectangle: -10.873,-2.885 -9.87,-2.615
  rectangle: -10.873,-2.385 -9.87,-2.115
  rectangle: -10.873,-1.885 -9.87,-1.615
  rectangle: -10.873,-1.385 -9.87,-1.115
  rectangle: -10.873,-0.885 -9.87,-0.615
  rectangle: -10.873,-0.385 -9.87,-0.115
  rectangle: -10.873,0.115 -9.87,0.385
  rectangle: -10.873,0.615 -9.87,0.885
  rectangle: -10.873,1.115 -9.87,1.385
  rectangle: -10.873,1.615 -9.87,1.885
  rectangle: -10.873,2.115 -9.87,2.385
  rectangle: -10.873,2.615 -9.87,2.885
  rectangle: -10.873,3.115 -9.87,3.385
  rectangle: -10.873,3.615 -9.87,3.885
  rectangle: -10.873,4.115 -9.87,4.385
  rectangle: -10.873,4.615 -9.87,4.885
  rectangle: -10.873,5.115 -9.87,5.385
  rectangle: -10.873,5.615 -9.87,5.885
  rectangle: -10.873,6.115 -9.87,6.385
  rectangle: -10.873,6.615 -9.87,6.885
  rectangle: -10.873,7.115 -9.87,7.385
  rectangle: -10.873,7.615 -9.87,7.885
  rectangle: -10.873,8.115 -9.87,8.385
  rectangle: -10.873,8.615 -9.87,8.885

## LQFP208 [mm]
pads (208):
  rect 1.4x0.29 smd: 1(-15.3,12.75) 2(-15.3,12.25) 3(-15.3,11.75) 4(-15.3,11.25) 5(-15.3,10.75) 6(-15.3,10.25) 7(-15.3,9.75) 8(-15.3,9.25) 9(-15.3,8.75) 10(-15.3,8.25) 11(-15.3,7.75) 12(-15.3,7.25) 13(-15.3,6.75) 14(-15.3,6.25) 15(-15.3,5.75) 16(-15.3,5.25) 17(-15.3,4.75) 18(-15.3,4.25) 19(-15.3,3.75) 20(-15.3,3.25) 21(-15.3,2.75) 22(-15.3,2.25) 23(-15.3,1.75) 24(-15.3,1.25) 25(-15.3,0.75) 26(-15.3,0.25) 27(-15.3,-0.25) 28(-15.3,-0.75) 29(-15.3,-1.25) 30(-15.3,-1.75) 31(-15.3,-2.25) 32(-15.3,-2.75) 33(-15.3,-3.25) 34(-15.3,-3.75) 35(-15.3,-4.25) 36(-15.3,-4.75) 37(-15.3,-5.25) 38(-15.3,-5.75) 39(-15.3,-6.25) 40(-15.3,-6.75) 41(-15.3,-7.25) 42(-15.3,-7.75) 43(-15.3,-8.25) 44(-15.3,-8.75) 45(-15.3,-9.25) 46(-15.3,-9.75) 47(-15.3,-10.25) 48(-15.3,-10.75) 49(-15.3,-11.25) 50(-15.3,-11.75) 51(-15.3,-12.25) 52(-15.3,-12.75) 105(15.3,-12.75) 106(15.3,-12.25) 107(15.3,-11.75) 108(15.3,-11.25) 109(15.3,-10.75) 110(15.3,-10.25) 111(15.3,-9.75) 112(15.3,-9.25) 113(15.3,-8.75) 114(15.3,-8.25) 115(15.3,-7.75) 116(15.3,-7.25) 117(15.3,-6.75) 118(15.3,-6.25) 119(15.3,-5.75) 120(15.3,-5.25) 121(15.3,-4.75) 122(15.3,-4.25) 123(15.3,-3.75) 124(15.3,-3.25) 125(15.3,-2.75) 126(15.3,-2.25) 127(15.3,-1.75) 128(15.3,-1.25) 129(15.3,-0.75) 130(15.3,-0.25) 131(15.3,0.25) 132(15.3,0.75) 133(15.3,1.25) 134(15.3,1.75) 135(15.3,2.25) 136(15.3,2.75) 137(15.3,3.25) 138(15.3,3.75) 139(15.3,4.25) 140(15.3,4.75) 141(15.3,5.25) 142(15.3,5.75) 143(15.3,6.25) 144(15.3,6.75) 145(15.3,7.25) 146(15.3,7.75) 147(15.3,8.25) 148(15.3,8.75) 149(15.3,9.25) 150(15.3,9.75) 151(15.3,10.25) 152(15.3,10.75) 153(15.3,11.25) 154(15.3,11.75) 155(15.3,12.25) 156(15.3,12.75)
  rect 0.29x1.4 smd: 53(-12.75,-15.3) 54(-12.25,-15.3) 55(-11.75,-15.3) 56(-11.25,-15.3) 57(-10.75,-15.3) 58(-10.25,-15.3) 59(-9.75,-15.3) 60(-9.25,-15.3) 61(-8.75,-15.3) 62(-8.25,-15.3) 63(-7.75,-15.3) 64(-7.25,-15.3) 65(-6.75,-15.3) 66(-6.25,-15.3) 67(-5.75,-15.3) 68(-5.25,-15.3) 69(-4.75,-15.3) 70(-4.25,-15.3) 71(-3.75,-15.3) 72(-3.25,-15.3) 73(-2.75,-15.3) 74(-2.25,-15.3) 75(-1.75,-15.3) 76(-1.25,-15.3) 77(-0.75,-15.3) 78(-0.25,-15.3) 79(0.25,-15.3) 80(0.75,-15.3) 81(1.25,-15.3) 82(1.75,-15.3) 83(2.25,-15.3) 84(2.75,-15.3) 85(3.25,-15.3) 86(3.75,-15.3) 87(4.25,-15.3) 88(4.75,-15.3) 89(5.25,-15.3) 90(5.75,-15.3) 91(6.25,-15.3) 92(6.75,-15.3) 93(7.25,-15.3) 94(7.75,-15.3) 95(8.25,-15.3) 96(8.75,-15.3) 97(9.25,-15.3) 98(9.75,-15.3) 99(10.25,-15.3) 100(10.75,-15.3) 101(11.25,-15.3) 102(11.75,-15.3) 103(12.25,-15.3) 104(12.75,-15.3) 157(12.75,15.3) 158(12.25,15.3) 159(11.75,15.3) 160(11.25,15.3) 161(10.75,15.3) 162(10.25,15.3) 163(9.75,15.3) 164(9.25,15.3) 165(8.75,15.3) 166(8.25,15.3) 167(7.75,15.3) 168(7.25,15.3) 169(6.75,15.3) 170(6.25,15.3) 171(5.75,15.3) 172(5.25,15.3) 173(4.75,15.3) 174(4.25,15.3) 175(3.75,15.3) 176(3.25,15.3) 177(2.75,15.3) 178(2.25,15.3) 179(1.75,15.3) 180(1.25,15.3) 181(0.75,15.3) 182(0.25,15.3) 183(-0.25,15.3) 184(-0.75,15.3) 185(-1.25,15.3) 186(-1.75,15.3) 187(-2.25,15.3) 188(-2.75,15.3) 189(-3.25,15.3) 190(-3.75,15.3) 191(-4.25,15.3) 192(-4.75,15.3) 193(-5.25,15.3) 194(-5.75,15.3) 195(-6.25,15.3) 196(-6.75,15.3) 197(-7.25,15.3) 198(-7.75,15.3) 199(-8.25,15.3) 200(-8.75,15.3) 201(-9.25,15.3) 202(-9.75,15.3) 203(-10.25,15.3) 204(-10.75,15.3) 205(-11.25,15.3) 206(-11.75,15.3) 207(-12.25,15.3) 208(-12.75,15.3)
Top Overlay:
  drawing of 215 lines, arcs and shapes, not listed
Mechanical 16:
  drawing of 208 lines, arcs and shapes, not listed

## MICROSD [mm]
pads (12):
  rect 0.7x1.5 smd: 1(9,-10.64) 2(7.9,-10.24) 3(6.8,-10.64) 4(5.7,-11.04) 5(4.6,-10.64) 6(3.5,-11.04) 7(2.4,-10.64) 8(1.3,-10.64)
  rect 1.8x1.4 smd: CD1(2,-0.44) CD2(8,-0.44)
  rect 1.4x1.9 smd: MT1(0.4,-13.54) MT2(13.6,-14.44)
Top Overlay:
  lines w0.203: 0,-11.9 0,-0.04 0.792,-0.04 ; 1.7,-13.54 11.4,-13.54 ; 3.302,-0.04 6.634,-0.04 ; 9.398,-0.04 14,-0.04 14,-12.6
Mechanical 16:
  lines w0.203: 0,-11.938 0,-14.44 1,-14.44 cw(c1.8,-14.34) 1.7,-13.54 ; 0,-0.04 14,-0.04 ; 0.4,-19.4 ccw(c1.6,-19.4) 1.6,-20.6 10.8,-20.6 ccw(c10.9,-19.4) 12.1,-19.5 ; 0.4,-15.6 ccw(c1.6,-15.6) 1.6,-16.8 10.8,-16.8 ccw(c10.9,-15.6) 12.1,-15.7 ; 0.4,-14.7 ccw(c1.6,-14.7) 1.6,-15.9 10.8,-15.9 ccw(c10.9,-14.7) 12.1,-14.8 ; 11.4,-13.54 cw(c11.4,-15.14) 13,-15.14 14,-15.14 14,-12.7

## MINIMOLD6 [mm]
pads (6):
  rect 0.26x0.65 smd: P$1(-0.5,-0.65) P$2(0,-0.65) P$3(0.5,-0.65) P$4(0.5,0.65) P$5(0,0.65) P$6(-0.5,0.65)
Top Overlay:
  circle w0.203: c-1.2,-0.7 r0.141
Mechanical 16:
  lines w0.203: -0.75,-0.65 0.75,-0.65 0.75,0.65 -0.75,0.65 -0.75,-0.65

## MOLEX20_RIGHTANGLE [mm]
pads (20):
  rect 1x4 smd: 1(11.43,0) 3(8.89,0) 5(6.35,0) 7(3.81,0) 9(1.27,0) 11(-1.27,0) 13(-3.81,0) 15(-6.35,0) 17(-8.89,0) 19(-11.43,0)
  rect 1x4 smd far side: 2(11.43,0) 4(8.89,0) 6(6.35,0) 8(3.81,0) 10(1.27,0) 12(-1.27,0) 14(-3.81,0) 16(-6.35,0) 18(-8.89,0) 20(-11.43,0)
Top Overlay:
  region: 0,0 0.254,0 0.254,0.254 0,0.254
Mechanical 16:
  text "19" at -12.065,2.54 h1.26
  text "17" at -9.525,2.54 h1.26
  text "15" at -6.985,2.54 h1.26
  text "13" at -4.445,2.54 h1.26
  text "11" at -1.905,2.54 h1.26
  text "9" at 0.953,2.54 h1.26
  text "7" at 3.492,2.54 h1.26
  text "5" at 6.032,2.54 h1.26
  text "3" at 8.572,2.54 h1.26
  text "1" at 11.112,2.54 h1.26
Mechanical 30:
  text "20" at -10.795,-3.492 h1.26
  text "18" at -8.255,-3.492 h1.26
  text "16" at -5.715,-3.492 h1.26
  text "14" at -3.175,-3.492 h1.26
  text "12" at -0.635,-3.492 h1.26
  text "10" at 1.905,-3.492 h1.26
  text "8" at 4.127,-3.492 h1.26
  text "6" at 6.667,-3.492 h1.26
  text "4" at 9.207,-3.492 h1.26
  text "2" at 11.747,-3.492 h1.26

## MOUNTINGHOLE_1.0_PLATED [mm]
pads (1):
  round 3 hole 1: P$1(0,0)
Top Overlay:
  circle w0.203: c0,0 r1.75
Mechanical 8 keep-out:
  circle w2.032: c0,0 r1
Mechanical 9 keep-out:
  circle w2.032: c0,0 r1
Mechanical 10:
  circle w2.032: c0,0 r1
Mechanical 13:
  text "1,0" at -0.87,-2.74 h1.26
Mechanical 27:
  circle w2.032: c0,0 r1
Mechanical 28:
  circle w2.032: c0,0 r1

## MOUNTINGHOLE_2.0_PLATED [mm]
pads (1):
  round 3 hole 2.2: P$1(0,0)
Top Overlay:
  circle w0.203: c0,0 r1.75
Mechanical 8 keep-out:
  circle w2.032: c0,0 r1
Mechanical 9 keep-out:
  circle w2.032: c0,0 r1
Mechanical 10:
  circle w2.032: c0,0 r1
Mechanical 13:
  text "2,0" at -0.87,-2.74 h1.26
Mechanical 27:
  circle w2.032: c0,0 r1
Mechanical 28:
  circle w2.032: c0,0 r1